# Altium integrated library LEMO Unipole And Multipole Type Connectors.IntLib: 1566 symbols (part 13 of 13) (continued)
## PLB.M0.4GL.NR (continued)
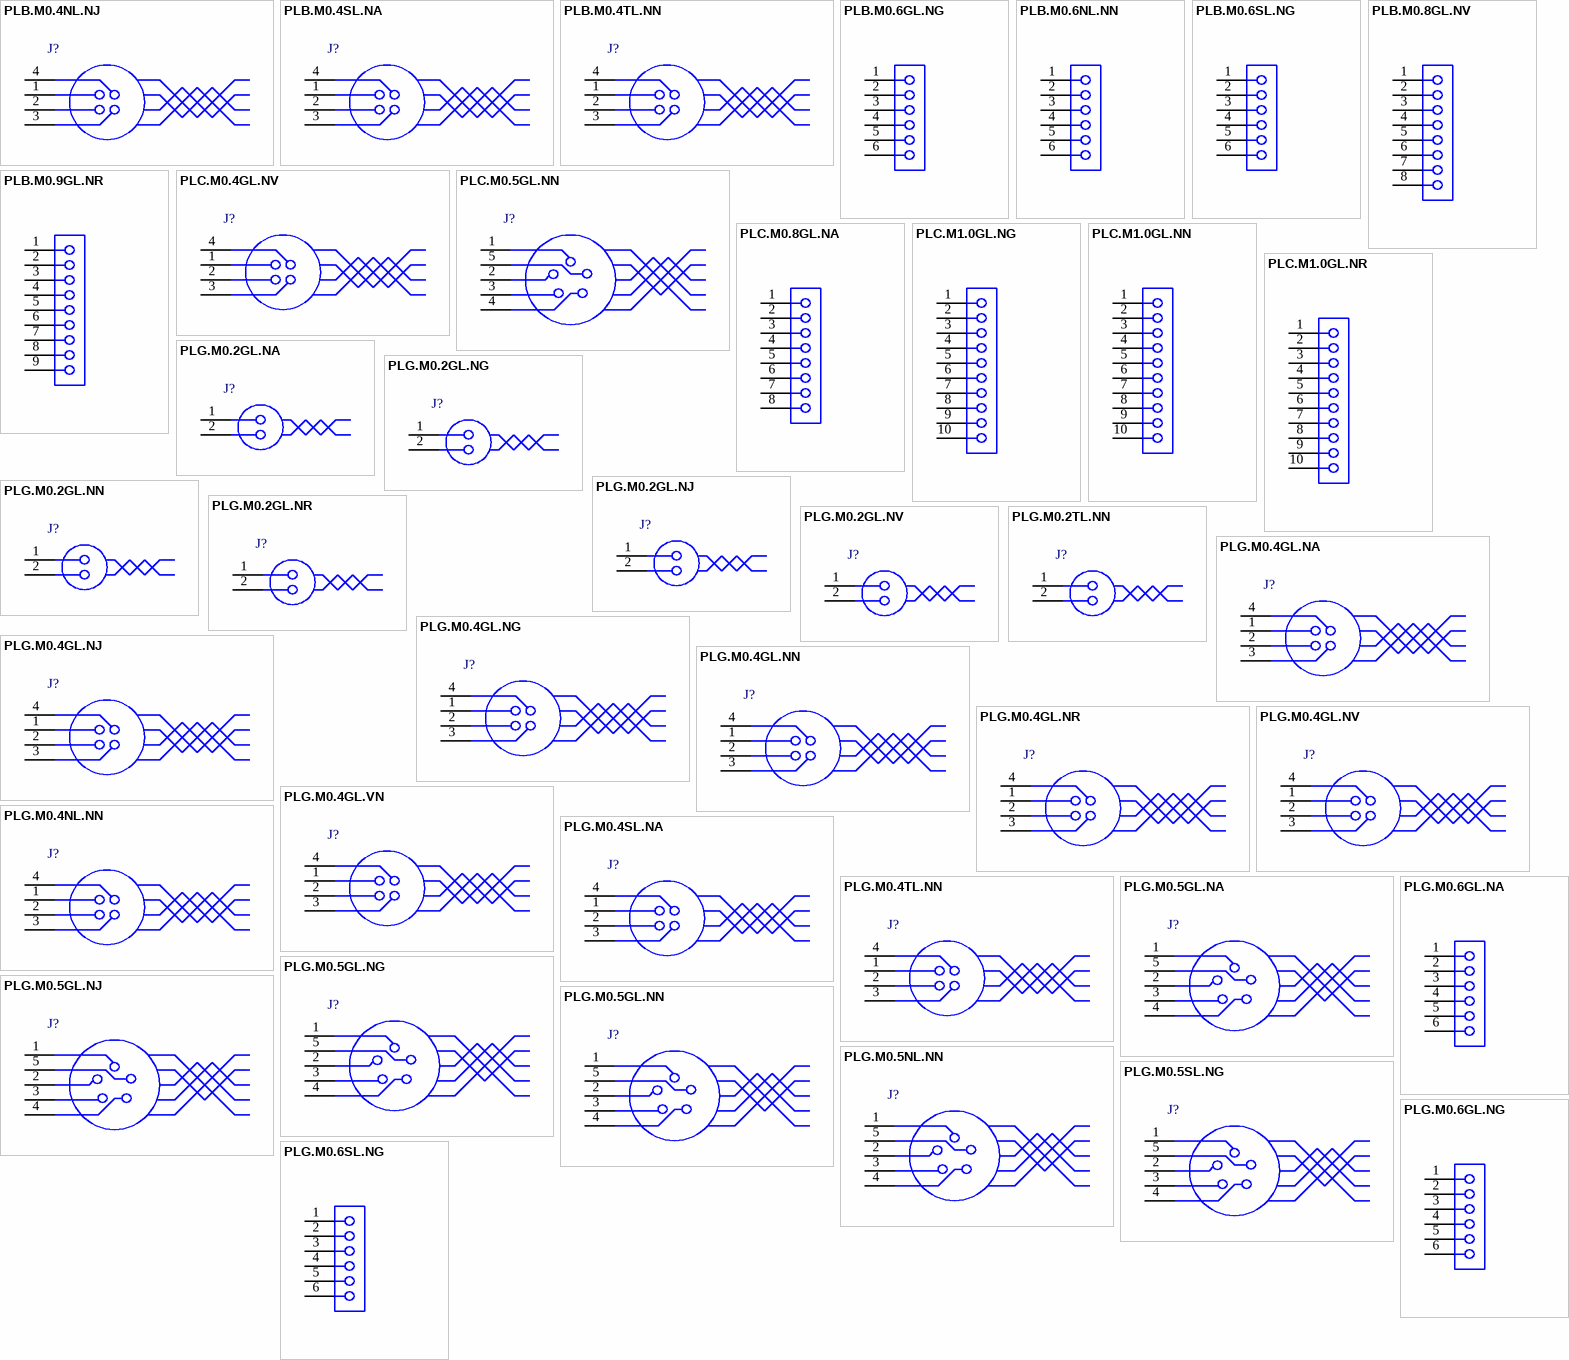
[diagram p41: symbols PLB.M0.4NL.NJ to PLG.M0.6SL.NG]

## PLB.M0.4NL.NJ
designator J?
Fixed receptacle, nut fixing, Key (B),  series, Multipole Type with 4 Contacts; Manufacturer: LEMO; PartNumber: PLB.M0.4NL.NJ; Number of contacts: 4; Contact Diameter: 0.9 mm; Test voltage (kV rms) Contact-Contact: 1.2; Rated Current(A): 8; DatasheetVersion: Jun-14; PackageReference: PLB.M0.4NL.NJ; PackageDescription: Fixed receptacle, nut fixing, Key(B) for Printed Circuit; ComponentLink1Description: Manufacturer URL; ComponentLink1URL: http://www.lemo.com; ComponentLink2Description: Datasheet; ComponentLink2URL: http://intra.lemo.ch/catalog/ROW/UK_English/P_series_catalog.pdf
footprint PLB.M0.4NL.NJ (Socket, Female, Height 25 mm, Through hole)
pins: 1, 2, 3, 4

## PLB.M0.4SL.NA
designator J?
Fixed receptacle, nut fixing, Key (B), P series, Multipole Type with 4 Contacts; Manufacturer: LEMO; PartNumber: PLB.M0.4SL.NA; Number of contacts: 4; Contact Diameter: 0.9 mm; Test voltage (kV rms) Contact-Contact: 1.2; Rated Current(A): 8; DatasheetVersion: Jun-14; PackageReference: PLB.M0.4SL.NA; PackageDescription: Fixed receptacle, nut fixing, Key(B) for Printed Circuit; ComponentLink1Description: Manufacturer URL; ComponentLink1URL: http://www.lemo.com; ComponentLink2Description: Datasheet; ComponentLink2URL: http://intra.lemo.ch/catalog/ROW/UK_English/P_series_catalog.pdf
footprint PLB.M0.4SL.NA (Socket, Female, Height 25 mm, Through hole)
pins: 1, 2, 3, 4

## PLB.M0.4TL.NN
designator J?
Fixed receptacle, nut fixing, Key (B), P series, Multipole Type with 4 Contacts; Manufacturer: LEMO; PartNumber: PLB.M0.4TL.NN; Number of contacts: 4; Contact Diameter: 0.9 mm; Test voltage (kV rms) Contact-Contact: 1.2; Rated Current(A): 8; DatasheetVersion: Jun-14; PackageReference: PLB.M0.4TL.NN; PackageDescription: Fixed receptacle, nut fixing, Key(B) for Printed Circuit; ComponentLink1Description: Manufacturer URL; ComponentLink1URL: http://www.lemo.com; ComponentLink2Description: Datasheet; ComponentLink2URL: http://intra.lemo.ch/catalog/ROW/UK_English/P_series_catalog.pdf
footprint PLB.M0.4TL.NN (Socket, Female, Height 25 mm, Through hole)
pins: 1, 2, 3, 4

## PLB.M0.6GL.NG
designator J?
Fixed receptacle, nut fixing, Key (B), P series, Multipole Type with 6 Contacts; Manufacturer: LEMO; PartNumber: PLB.M0.6GL.NG; Number of contacts: 6; Contact Diameter: 0.7 mm; Test voltage (kV rms) Contact-Contact: 1.05; DatasheetVersion: Jun-14; PackageReference: PLB.M0.6GL.NG; PackageDescription: Fixed receptacle, nut fixing, Key(B) for Printed Circuit; Rated Current(A): 6; ComponentLink1Description: Manufacturer URL; ComponentLink1URL: http://www.lemo.com; ComponentLink2Description: Datasheet; ComponentLink2URL: http://intra.lemo.ch/catalog/ROW/UK_English/P_series_catalog.pdf
footprint PLB.M0.6GL.NG (Socket, Female, Height 25 mm, Through hole)
pins: 1, 2, 3, 4, 5, 6

## PLB.M0.6NL.NN
designator J?
Fixed receptacle, nut fixing, Key (B), P series, Multipole Type with 6 Contacts; Manufacturer: LEMO; PartNumber: PLB.M0.6NL.NN; Number of contacts: 6; Contact Diameter: 0.7 mm; Test voltage (kV rms) Contact-Contact: 1.05; DatasheetVersion: Jun-14; PackageReference: PLB.M0.6NL.NN; PackageDescription: Fixed receptacle, nut fixing, Key(B) for Printed Circuit; Rated Current(A): 6; ComponentLink1Description: Manufacturer URL; ComponentLink1URL: http://www.lemo.com; ComponentLink2Description: Datasheet; ComponentLink2URL: http://intra.lemo.ch/catalog/ROW/UK_English/P_series_catalog.pdf
footprint PLB.M0.6NL.NN (Socket, Female, Height 25 mm, Through hole)
pins: 1, 2, 3, 4, 5, 6

## PLB.M0.6SL.NG
designator J?
Fixed receptacle, nut fixing, Key (B), P series, Multipole Type with 6 Contacts; Manufacturer: LEMO; PartNumber: PLB.M0.6SL.NG; Number of contacts: 6; Contact Diameter: 0.7 mm; Test voltage (kV rms) Contact-Contact: 1.05; DatasheetVersion: Jun-14; PackageReference: PLB.M0.6SL.NG; PackageDescription: Fixed receptacle, nut fixing, Key(B) for Printed Circuit; Rated Current(A): 6; ComponentLink1Description: Manufacturer URL; ComponentLink1URL: http://www.lemo.com; ComponentLink2Description: Datasheet; ComponentLink2URL: http://intra.lemo.ch/catalog/ROW/UK_English/P_series_catalog.pdf
footprint PLB.M0.6SL.NG (Socket, Female, Height 25 mm, Through hole)
pins: 1, 2, 3, 4, 5, 6

## PLB.M0.8GL.NV
designator J?
Fixed receptacle, nut fixing, Key (B), P series, Multipole Type with 8 Contacts; Manufacturer: LEMO; PartNumber: PLB.M0.8GL.NV; Number of contacts: 8; Contact Diameter: 0.7 mm; Test voltage (kV rms) Contact-Contact: 1.05; Rated Current(A): 5; DatasheetVersion: Jun-14; PackageReference: PLB.M0.8GL.NV; PackageDescription: Fixed receptacle, nut fixing, Key(B) for Printed Circuit; ComponentLink1Description: Manufacturer URL; ComponentLink1URL: http://www.lemo.com; ComponentLink2Description: Datasheet; ComponentLink2URL: http://intra.lemo.ch/catalog/ROW/UK_English/P_series_catalog.pdf
footprint PLB.M0.8GL.NV (Socket, Female, Height 25 mm, Through hole)
pins: 1, 2, 3, 4, 5, 6, 7, 8

## PLB.M0.9GL.NR
designator J?
Fixed receptacle, nut fixing, Key (B), P series, Multipole Type with 9 Contacts; Manufacturer: LEMO; PartNumber: PLB.M0.9GL.NR; Number of contacts: 9; Contact Diameter: 0.5 mm; Test voltage (kV rms) Contact-Contact: 0.85; Rated Current(A): 3; DatasheetVersion: Jun-14; PackageReference: PLB.M0.9GL.NR; PackageDescription: Fixed receptacle, nut fixing, Key(B) for Printed Circuit; ComponentLink1Description: Manufacturer URL; ComponentLink1URL: http://www.lemo.com; ComponentLink2Description: Datasheet; ComponentLink2URL: http://intra.lemo.ch/catalog/ROW/UK_English/P_series_catalog.pdf
footprint PLB.M0.9GL.NR (Socket, Female, Height 25 mm, Through hole)
pins: 1, 2, 3, 4, 5, 6, 7, 8, 9

## PLC.M0.4GL.NV
designator J?
Fixed receptacle, nut fixing, Key (C), P series, Multipole Type with 4 Contacts; Manufacturer: LEMO; PartNumber: PLC.M0.4GL.NV; Number of contacts: 4; Contact Diameter: 0.9 mm; Test voltage (kV rms) Contact-Contact: 1.2; Rated Current(A): 8; DatasheetVersion: Jun-14; PackageReference: PLC.M0.4GL.NV; PackageDescription: Fixed receptacle, nut fixing, Key(C) for Printed Circuit; ComponentLink1Description: Manufacturer URL; ComponentLink1URL: http://www.lemo.com; ComponentLink2Description: Datasheet; ComponentLink2URL: http://intra.lemo.ch/catalog/ROW/UK_English/P_series_catalog.pdf
footprint PLC.M0.4GL.NV (Socket, Female, Height 25 mm, Through hole)
pins: 1, 2, 3, 4

## PLC.M0.5GL.NN
designator J?
Fixed receptacle, nut fixing, Key (C), P series, Multipole Type with 5 Contacts; Manufacturer: LEMO; PartNumber: PLC.M0.5GL.NN; Number of contacts: 5; Contact Diameter: 0.9 mm; Test voltage (kV rms) Contact-Contact: 1.05; Rated Current(A): 7; DatasheetVersion: Jun-14; PackageReference: PLC.M0.5GL.NN; PackageDescription: Fixed receptacle, nut fixing, Key(C) for Printed Circuit; ComponentLink1Description: Manufacturer URL; ComponentLink1URL: http://www.lemo.com; ComponentLink2Description: Datasheet; ComponentLink2URL: http://intra.lemo.ch/catalog/ROW/UK_English/P_series_catalog.pdf
footprint PLC.M0.5GL.NN (Socket, Female, Height 25 mm, Through hole)
pins: 1, 2, 3, 4, 5

## PLC.M0.8GL.NA
designator J?
Fixed receptacle, nut fixing, Key (C), P series, Multipole Type with 8 Contacts; Manufacturer: LEMO; PartNumber: PLC.M0.8GL.NA; Number of contacts: 8; Contact Diameter: 0.7 mm; Test voltage (kV rms) Contact-Contact: 1.05; Rated Current(A): 5; DatasheetVersion: Jun-14; PackageReference: PLC.M0.8GL.NA; PackageDescription: Fixed receptacle, nut fixing, Key(C) for Printed Circuit; ComponentLink1Description: Manufacturer URL; ComponentLink1URL: http://www.lemo.com; ComponentLink2Description: Datasheet; ComponentLink2URL: http://intra.lemo.ch/catalog/ROW/UK_English/P_series_catalog.pdf
footprint PLC.M0.8GL.NA (Socket, Female, Height 25 mm, Through hole)
pins: 1, 2, 3, 4, 5, 6, 7, 8

## PLC.M1.0GL.NG
designator J?
Fixed receptacle, nut fixing, Key (C), P series, Multipole Type with 10 Contacts; Manufacturer: LEMO; PartNumber: PLC.M1.0GL.NG; Number of contacts: 10; Contact Diameter: 0.5 mm; Test voltage (kV rms) Contact-Contact: 0.85; Rated Current(A): 3; DatasheetVersion: Jun-14; PackageReference: PLC.M1.0GL.NG; PackageDescription: Fixed receptacle, nut fixing, Key(C) for Printed Circuit; ComponentLink1Description: Manufacturer URL; ComponentLink1URL: http://www.lemo.com; ComponentLink2Description: Datasheet; ComponentLink2URL: http://intra.lemo.ch/catalog/ROW/UK_English/P_series_catalog.pdf
footprint PLC.M1.0GL.NG (Socket, Female, Height 25 mm, Through hole)
pins: 1, 2, 3, 4, 5, 6, 7, 8, 9, 10

## PLC.M1.0GL.NN
designator J?
Fixed receptacle, nut fixing, Key (C), P series, Multipole Type with 10 Contacts; Manufacturer: LEMO; PartNumber: PLC.M1.0GL.NN; Number of contacts: 10; Contact Diameter: 0.5 mm; Test voltage (kV rms) Contact-Contact: 0.85; Rated Current(A): 3; DatasheetVersion: Jun-14; PackageReference: PLC.M1.0GL.NN; PackageDescription: Fixed receptacle, nut fixing, Key(C) for Printed Circuit; ComponentLink1Description: Manufacturer URL; ComponentLink1URL: http://www.lemo.com; ComponentLink2Description: Datasheet; ComponentLink2URL: http://intra.lemo.ch/catalog/ROW/UK_English/P_series_catalog.pdf
footprint PLC.M1.0GL.NN (Socket, Female, Height 25 mm, Through hole)
pins: 1, 2, 3, 4, 5, 6, 7, 8, 9, 10

## PLC.M1.0GL.NR
designator J?
Fixed receptacle, nut fixing, Key (C), P series, Multipole Type with 10 Contacts; Manufacturer: LEMO; PartNumber: PLC.M1.0GL.NR; Number of contacts: 10; Contact Diameter: 0.5 mm; Test voltage (kV rms) Contact-Contact: 0.85; Rated Current(A): 3; DatasheetVersion: Jun-14; PackageReference: PLC.M1.0GL.NR; PackageDescription: Fixed receptacle, nut fixing, Key(C) for Printed Circuit; ComponentLink1Description: Manufacturer URL; ComponentLink1URL: http://www.lemo.com; ComponentLink2Description: Datasheet; ComponentLink2URL: http://intra.lemo.ch/catalog/ROW/UK_English/P_series_catalog.pdf
footprint PLC.M1.0GL.NR (Socket, Female, Height 25 mm, Through hole)
pins: 1, 2, 3, 4, 5, 6, 7, 8, 9, 10

## PLG.M0.2GL.NA
designator J?
Fixed receptacle, nut fixing, Key (G), P series, Multipole Type with 2 Contacts; Manufacturer: LEMO; PartNumber: PLG.M0.2GL.NA; Number of contacts: 2; Contact Diameter: 1.3 mm; Test voltage (kV rms) Contact-Contact: 1.2; Rated Current(A): 10; DatasheetVersion: Jun-14; PackageReference: PLG.M0.2GL.NA; PackageDescription: Fixed receptacle, nut fixing, Key(G) for Printed Circuit; ComponentLink1Description: Manufacturer URL; ComponentLink1URL: http://www.lemo.com; ComponentLink2Description: Datasheet; ComponentLink2URL: http://intra.lemo.ch/catalog/ROW/UK_English/P_series_catalog.pdf
footprint PLG.M0.2GL.NA (Socket, Female, Height 25 mm, Through hole)
pins: 1, 2

## PLG.M0.2GL.NG
designator J?
Fixed receptacle, nut fixing, Key (G), P series, Multipole Type with 2 Contacts; Manufacturer: LEMO; PartNumber: PLG.M0.2GL.NG; Number of contacts: 2; Contact Diameter: 1.3 mm; Test voltage (kV rms) Contact-Contact: 1.2; Rated Current(A): 10; DatasheetVersion: Jun-14; PackageReference: PLG.M0.2GL.NG; PackageDescription: Fixed receptacle, nut fixing, Key(G) for Printed Circuit; ComponentLink1Description: Manufacturer URL; ComponentLink1URL: http://www.lemo.com; ComponentLink2Description: Datasheet; ComponentLink2URL: http://intra.lemo.ch/catalog/ROW/UK_English/P_series_catalog.pdf
footprint PLG.M0.2GL.NG (Socket, Female, Height 25 mm, Through hole)
pins: 1, 2

## PLG.M0.2GL.NJ
designator J?
Fixed receptacle, nut fixing, Key (G), P series, Multipole Type with 2 Contacts; Manufacturer: LEMO; PartNumber: PLG.M0.2GL.NJ; Number of contacts: 2; Contact Diameter: 1.3 mm; Test voltage (kV rms) Contact-Contact: 1.2; Rated Current(A): 10; DatasheetVersion: Jun-14; PackageReference: PLG.M0.2GL.NJ; PackageDescription: Fixed receptacle, nut fixing, Key(G) for Printed Circuit; ComponentLink1Description: Manufacturer URL; ComponentLink1URL: http://www.lemo.com; ComponentLink2Description: Datasheet; ComponentLink2URL: http://intra.lemo.ch/catalog/ROW/UK_English/P_series_catalog.pdf
footprint PLG.M0.2GL.NJ (Socket, Female, Height 25 mm, Through hole)
pins: 1, 2

## PLG.M0.2GL.NN
designator J?
Fixed receptacle, nut fixing, Key (G), P series, Multipole Type with 2 Contacts; Manufacturer: LEMO; PartNumber: PLG.M0.2GL.NN; Number of contacts: 2; Contact Diameter: 1.3 mm; Test voltage (kV rms) Contact-Contact: 1.2; Rated Current(A): 10; DatasheetVersion: Jun-14; PackageReference: PLG.M0.2GL.NN; PackageDescription: Fixed receptacle, nut fixing, Key(G) for Printed Circuit; ComponentLink1Description: Manufacturer URL; ComponentLink1URL: http://www.lemo.com; ComponentLink2Description: Datasheet; ComponentLink2URL: http://intra.lemo.ch/catalog/ROW/UK_English/P_series_catalog.pdf
footprint PLG.M0.2GL.NN (Socket, Female, Height 25 mm, Through hole)
pins: 1, 2

## PLG.M0.2GL.NR
designator J?
Fixed receptacle, nut fixing, Key (G), P series, Multipole Type with 2 Contacts; Manufacturer: LEMO; PartNumber: PLG.M0.2GL.NR; Number of contacts: 2; Contact Diameter: 1.3 mm; Test voltage (kV rms) Contact-Contact: 1.2; Rated Current(A): 10; DatasheetVersion: Jun-14; PackageReference: PLG.M0.2GL.NR; PackageDescription: Fixed receptacle, nut fixing, Key(G) for Printed Circuit; ComponentLink1Description: Manufacturer URL; ComponentLink1URL: http://www.lemo.com; ComponentLink2Description: Datasheet; ComponentLink2URL: http://intra.lemo.ch/catalog/ROW/UK_English/P_series_catalog.pdf
footprint PLG.M0.2GL.NR (Socket, Female, Height 25 mm, Through hole)
pins: 1, 2

## PLG.M0.2GL.NV
designator J?
Fixed receptacle, nut fixing, Key (G), P series, Multipole Type with 2 Contacts; Manufacturer: LEMO; PartNumber: PLG.M0.2GL.NV; Number of contacts: 2; Contact Diameter: 1.3 mm; Test voltage (kV rms) Contact-Contact: 1.2; Rated Current(A): 10; DatasheetVersion: Jun-14; PackageReference: PLG.M0.2GL.NV; PackageDescription: Fixed receptacle, nut fixing, Key(G) for Printed Circuit; ComponentLink1Description: Manufacturer URL; ComponentLink1URL: http://www.lemo.com; ComponentLink2Description: Datasheet; ComponentLink2URL: http://intra.lemo.ch/catalog/ROW/UK_English/P_series_catalog.pdf
footprint PLG.M0.2GL.NV (Socket, Female, Height 25 mm, Through hole)
pins: 1, 2

## PLG.M0.2TL.NN
designator J?
Fixed receptacle, nut fixing, Key (G), P series, Multipole Type with 2 Contacts; Manufacturer: LEMO; PartNumber: PLG.M0.2TL.NN; Number of contacts: 2; Contact Diameter: 1.3 mm; Test voltage (kV rms) Contact-Contact: 1.2; Rated Current(A): 10; DatasheetVersion: Jun-14; PackageReference: PLG.M0.2TL.NN; PackageDescription: Fixed receptacle, nut fixing, Key(G) for Printed Circuit; ComponentLink1Description: Manufacturer URL; ComponentLink1URL: http://www.lemo.com; ComponentLink2Description: Datasheet; ComponentLink2URL: http://intra.lemo.ch/catalog/ROW/UK_English/P_series_catalog.pdf
footprint PLG.M0.2TL.NN (Socket, Female, Height 25 mm, Through hole)
pins: 1, 2

## PLG.M0.4GL.NA
designator J?
Fixed receptacle, nut fixing, Key (G), P series, Multipole Type with 4 Contacts; Manufacturer: LEMO; PartNumber: PLG.M0.4GL.NA; Number of contacts: 4; Contact Diameter: 0.9 mm; Test voltage (kV rms) Contact-Contact: 1.2; Rated Current(A): 8; DatasheetVersion: Jun-14; PackageReference: PLG.M0.4GL.NA; PackageDescription: Fixed receptacle, nut fixing, Key(G) for Printed Circuit; ComponentLink1Description: Manufacturer URL; ComponentLink1URL: http://www.lemo.com; ComponentLink2Description: Datasheet; ComponentLink2URL: http://intra.lemo.ch/catalog/ROW/UK_English/P_series_catalog.pdf
footprint PLG.M0.4GL.NA (Socket, Female, Height 25 mm, Through hole)
pins: 1, 2, 3, 4

## PLG.M0.4GL.NG
designator J?
Fixed receptacle, nut fixing, Key (G), P series, Multipole Type with 4 Contacts; Manufacturer: LEMO; PartNumber: PLG.M0.4GL.NG; Number of contacts: 4; Contact Diameter: 0.9 mm; Test voltage (kV rms) Contact-Contact: 1.2; Rated Current(A): 8; DatasheetVersion: Jun-14; PackageReference: PLG.M0.4GL.NG; PackageDescription: Fixed receptacle, nut fixing, Key(G) for Printed Circuit; ComponentLink1Description: Manufacturer URL; ComponentLink1URL: http://www.lemo.com; ComponentLink2Description: Datasheet; ComponentLink2URL: http://intra.lemo.ch/catalog/ROW/UK_English/P_series_catalog.pdf
footprint PLG.M0.4GL.NG (Socket, Female, Height 25 mm, Through hole)
pins: 1, 2, 3, 4

## PLG.M0.4GL.NJ
designator J?
Fixed receptacle, nut fixing, Key (G), P series, Multipole Type with 4 Contacts; Manufacturer: LEMO; PartNumber: PLG.M0.4GL.NJ; Number of contacts: 4; Contact Diameter: 0.9 mm; Test voltage (kV rms) Contact-Contact: 1.2; Rated Current(A): 8; DatasheetVersion: Jun-14; PackageReference: PLG.M0.4GL.NJ; PackageDescription: Fixed receptacle, nut fixing, Key(G) for Printed Circuit; ComponentLink1Description: Manufacturer URL; ComponentLink1URL: http://www.lemo.com; ComponentLink2Description: Datasheet; ComponentLink2URL: http://intra.lemo.ch/catalog/ROW/UK_English/P_series_catalog.pdf
footprint PLG.M0.4GL.NJ (Socket, Female, Height 25 mm, Through hole)
pins: 1, 2, 3, 4

## PLG.M0.4GL.NN
designator J?
Fixed receptacle, nut fixing, Key (G), P series, Multipole Type with 4 Contacts; Manufacturer: LEMO; PartNumber: PLG.M0.4GL.NN; Number of contacts: 4; Contact Diameter: 0.9 mm; Test voltage (kV rms) Contact-Contact: 1.2; Rated Current(A): 8; DatasheetVersion: Jun-14; PackageReference: PLG.M0.4GL.NN; PackageDescription: Fixed receptacle, nut fixing, Key(G) for Printed Circuit; ComponentLink1Description: Manufacturer URL; ComponentLink1URL: http://www.lemo.com; ComponentLink2Description: Datasheet; ComponentLink2URL: http://intra.lemo.ch/catalog/ROW/UK_English/P_series_catalog.pdf
footprint PLG.M0.4GL.NN (Socket, Female, Height 25 mm, Through hole)
pins: 1, 2, 3, 4

## PLG.M0.4GL.NR
designator J?
Fixed receptacle, nut fixing, Key (G), P series, Multipole Type with 4 Contacts; Manufacturer: LEMO; PartNumber: PLG.M0.4GL.NR; Number of contacts: 4; Contact Diameter: 0.9 mm; Test voltage (kV rms) Contact-Contact: 1.2; Rated Current(A): 8; DatasheetVersion: Jun-14; PackageReference: PLG.M0.4GL.NR; PackageDescription: Fixed receptacle, nut fixing, Key(G) for Printed Circuit; ComponentLink1Description: Manufacturer URL; ComponentLink1URL: http://www.lemo.com; ComponentLink2Description: Datasheet; ComponentLink2URL: http://intra.lemo.ch/catalog/ROW/UK_English/P_series_catalog.pdf
footprint PLG.M0.4GL.NR (Socket, Female, Height 25 mm, Through hole)
pins: 1, 2, 3, 4

## PLG.M0.4GL.NV
designator J?
Fixed receptacle, nut fixing, Key (G), P series, Multipole Type with 4 Contacts; Manufacturer: LEMO; PartNumber: PLG.M0.4GL.NV; Number of contacts: 4; Contact Diameter: 0.9 mm; Test voltage (kV rms) Contact-Contact: 1.2; Rated Current(A): 8; DatasheetVersion: Jun-14; PackageReference: PLG.M0.4GL.NV; PackageDescription: Fixed receptacle, nut fixing, Key(G) for Printed Circuit; ComponentLink1Description: Manufacturer URL; ComponentLink1URL: http://www.lemo.com; ComponentLink2Description: Datasheet; ComponentLink2URL: http://intra.lemo.ch/catalog/ROW/UK_English/P_series_catalog.pdf
footprint PLG.M0.4GL.NV (Socket, Female, Height 25 mm, Through hole)
pins: 1, 2, 3, 4

## PLG.M0.4GL.VN
designator J?
Fixed receptacle, nut fixing, Key (G), P series, Multipole Type with 4 Contacts; Manufacturer: LEMO; PartNumber: PLG.M0.4GL.VN; Number of contacts: 4; Contact Diameter: 0.9 mm; Test voltage (kV rms) Contact-Contact: 1.2; Rated Current(A): 8; DatasheetVersion: Jun-14; PackageReference: PLG.M0.4GL.VN; PackageDescription: Fixed receptacle, nut fixing, Key(G) for Printed Circuit; ComponentLink1Description: Manufacturer URL; ComponentLink1URL: http://www.lemo.com; ComponentLink2Description: Datasheet; ComponentLink2URL: http://intra.lemo.ch/catalog/ROW/UK_English/P_series_catalog.pdf
footprint PLG.M0.4GL.VN (Socket, Female, Height 25 mm, Through hole)
pins: 1, 2, 3, 4

## PLG.M0.4NL.NN
designator J?
Fixed receptacle, nut fixing, Key (G), P series, Multipole Type with 4 Contacts; Manufacturer: LEMO; PartNumber: PLG.M0.4NL.NN; Number of contacts: 4; Contact Diameter: 0.9 mm; Test voltage (kV rms) Contact-Contact: 1.2; Rated Current(A): 8; DatasheetVersion: Jun-14; PackageReference: PLG.M0.4NL.NN; PackageDescription: Fixed receptacle, nut fixing, Key(G) for Printed Circuit; ComponentLink1Description: Manufacturer URL; ComponentLink1URL: http://www.lemo.com; ComponentLink2Description: Datasheet; ComponentLink2URL: http://intra.lemo.ch/catalog/ROW/UK_English/P_series_catalog.pdf
footprint PLG.M0.4NL.NN (Socket, Female, Height 25 mm, Through hole)
pins: 1, 2, 3, 4

## PLG.M0.4SL.NA
designator J?
Fixed receptacle, nut fixing, Key (G), P series, Multipole Type with 4 Contacts; Manufacturer: LEMO; PartNumber: PLG.M0.4SL.NA; Number of contacts: 4; Contact Diameter: 0.9 mm; Test voltage (kV rms) Contact-Contact: 1.2; Rated Current(A): 8; DatasheetVersion: Jun-14; PackageReference: PLG.M0.4SL.NA; PackageDescription: Fixed receptacle, nut fixing, Key(G) for Printed Circuit; ComponentLink1Description: Manufacturer URL; ComponentLink1URL: http://www.lemo.com; ComponentLink2Description: Datasheet; ComponentLink2URL: http://intra.lemo.ch/catalog/ROW/UK_English/P_series_catalog.pdf
footprint PLG.M0.4SL.NA (Socket, Female, Height 25 mm, Through hole)
pins: 1, 2, 3, 4

## PLG.M0.4TL.NN
designator J?
Fixed receptacle, nut fixing, Key (G), P series, Multipole Type with 4 Contacts; Manufacturer: LEMO; PartNumber: PLG.M0.4TL.NN; Number of contacts: 4; Contact Diameter: 0.9 mm; Test voltage (kV rms) Contact-Contact: 1.2; Rated Current(A): 8; DatasheetVersion: Jun-14; PackageReference: PLG.M0.4TL.NN; PackageDescription: Fixed receptacle, nut fixing, Key(G) for Printed Circuit; ComponentLink1Description: Manufacturer URL; ComponentLink1URL: http://www.lemo.com; ComponentLink2Description: Datasheet; ComponentLink2URL: http://intra.lemo.ch/catalog/ROW/UK_English/P_series_catalog.pdf
footprint PLG.M0.4TL.NN (Socket, Female, Height 25 mm, Through hole)
pins: 1, 2, 3, 4

## PLG.M0.5GL.NA
designator J?
Fixed receptacle, nut fixing, Key (G), P series, Multipole Type with 5 Contacts; Manufacturer: LEMO; PartNumber: PLG.M0.5GL.NA; Number of contacts: 5; Contact Diameter: 0.9 mm; Test voltage (kV rms) Contact-Contact: 1.05; Rated Current(A): 7; DatasheetVersion: Jun-14; PackageReference: PLG.M0.5GL.NA; PackageDescription: Fixed receptacle, nut fixing, Key(G) for Printed Circuit; ComponentLink1Description: Manufacturer URL; ComponentLink1URL: http://www.lemo.com; ComponentLink2Description: Datasheet; ComponentLink2URL: http://intra.lemo.ch/catalog/ROW/UK_English/P_series_catalog.pdf
footprint PLG.M0.5GL.NA (Socket, Female, Height 25 mm, Through hole)
pins: 1, 2, 3, 4, 5

## PLG.M0.5GL.NG
designator J?
Fixed receptacle, nut fixing, Key (G), P series, Multipole Type with 5 Contacts; Manufacturer: LEMO; PartNumber: PLG.M0.5GL.NG; Number of contacts: 5; Contact Diameter: 0.9 mm; Test voltage (kV rms) Contact-Contact: 1.05; Rated Current(A): 7; DatasheetVersion: Jun-14; PackageReference: PLG.M0.5GL.NG; PackageDescription: Fixed receptacle, nut fixing, Key(G) for Printed Circuit; ComponentLink1Description: Manufacturer URL; ComponentLink1URL: http://www.lemo.com; ComponentLink2Description: Datasheet; ComponentLink2URL: http://intra.lemo.ch/catalog/ROW/UK_English/P_series_catalog.pdf
footprint PLG.M0.5GL.NG (Socket, Female, Height 25 mm, Through hole)
pins: 1, 2, 3, 4, 5

## PLG.M0.5GL.NJ
designator J?
Fixed receptacle, nut fixing, Key (G), P series, Multipole Type with 5 Contacts; Manufacturer: LEMO; PartNumber: PLG.M0.5GL.NJ; Number of contacts: 5; Contact Diameter: 0.9 mm; Test voltage (kV rms) Contact-Contact: 1.05; Rated Current(A): 7; DatasheetVersion: Jun-14; PackageReference: PLG.M0.5GL.NJ; PackageDescription: Fixed receptacle, nut fixing, Key(G) for Printed Circuit; ComponentLink1Description: Manufacturer URL; ComponentLink1URL: http://www.lemo.com; ComponentLink2Description: Datasheet; ComponentLink2URL: http://intra.lemo.ch/catalog/ROW/UK_English/P_series_catalog.pdf
footprint PLG.M0.5GL.NJ (Socket, Female, Height 25 mm, Through hole)
pins: 1, 2, 3, 4, 5

## PLG.M0.5GL.NN
designator J?
Fixed receptacle, nut fixing, Key (G), P series, Multipole Type with 5 Contacts; Manufacturer: LEMO; PartNumber: PLG.M0.5GL.NN; Number of contacts: 5; Contact Diameter: 0.9 mm; Test voltage (kV rms) Contact-Contact: 1.05; Rated Current(A): 7; DatasheetVersion: Jun-14; PackageReference: PLG.M0.5GL.NN; PackageDescription: Fixed receptacle, nut fixing, Key(G) for Printed Circuit; ComponentLink1Description: Manufacturer URL; ComponentLink1URL: http://www.lemo.com; ComponentLink2Description: Datasheet; ComponentLink2URL: http://intra.lemo.ch/catalog/ROW/UK_English/P_series_catalog.pdf
footprint PLG.M0.5GL.NN (Socket, Female, Height 25 mm, Through hole)
pins: 1, 2, 3, 4, 5

## PLG.M0.5NL.NN
designator J?
Fixed receptacle, nut fixing, Key (G), P series, Multipole Type with 5 Contacts; Manufacturer: LEMO; PartNumber: PLG.M0.5NL.NN; Number of contacts: 5; Contact Diameter: 0.9 mm; Test voltage (kV rms) Contact-Contact: 1.05; Rated Current(A): 7; DatasheetVersion: Jun-14; PackageReference: PLG.M0.5NL.NN; PackageDescription: Fixed receptacle, nut fixing, Key(G) for Printed Circuit; ComponentLink1Description: Manufacturer URL; ComponentLink1URL: http://www.lemo.com; ComponentLink2Description: Datasheet; ComponentLink2URL: http://intra.lemo.ch/catalog/ROW/UK_English/P_series_catalog.pdf
footprint PLG.M0.5NL.NN (Socket, Female, Height 25 mm, Through hole)
pins: 1, 2, 3, 4, 5

## PLG.M0.5SL.NG
designator J?
Fixed receptacle, nut fixing, Key (G), P series, Multipole Type with 5 Contacts; Manufacturer: LEMO; PartNumber: PLG.M0.5SL.NG; Number of contacts: 5; Contact Diameter: 0.9 mm; Test voltage (kV rms) Contact-Contact: 1.05; Rated Current(A): 7; DatasheetVersion: Jun-14; PackageReference: PLG.M0.5SL.NG; PackageDescription: Fixed receptacle, nut fixing, Key(G) for Printed Circuit; Supplier 1: Mouser; Supplier Part Number 1: 736-PLGM05SLNG; Supplier 2: Digi-Key; Supplier Part Number 2: PLG.M0.5SL.NG-ND; ComponentLink1Description: Manufacturer URL; ComponentLink1URL: http://www.lemo.com; ComponentLink2Description: Datasheet; ComponentLink2URL: http://intra.lemo.ch/catalog/ROW/UK_English/P_series_catalog.pdf
footprint PLG.M0.5SL.NG (Socket, Female, Height 25 mm, Through hole)
pins: 1, 2, 3, 4, 5

## PLG.M0.6GL.NA
designator J?
Fixed receptacle, nut fixing, Key (G), P series, Multipole Type with 6 Contacts; Manufacturer: LEMO; PartNumber: PLG.M0.6GL.NA; Number of contacts: 6; Contact Diameter: 0.7 mm; Test voltage (kV rms) Contact-Contact: 1.05; DatasheetVersion: Jun-14; PackageReference: PLG.M0.6GL.NA; PackageDescription: Fixed receptacle, nut fixing, Key(G) for Printed Circuit; Rated Current(A): 6; ComponentLink1Description: Manufacturer URL; ComponentLink1URL: http://www.lemo.com; ComponentLink2Description: Datasheet; ComponentLink2URL: http://intra.lemo.ch/catalog/ROW/UK_English/P_series_catalog.pdf
footprint PLG.M0.6GL.NA (Socket, Female, Height 25 mm, Through hole)
pins: 1, 2, 3, 4, 5, 6

## PLG.M0.6GL.NG
designator J?
Fixed receptacle, nut fixing, Key (G), P series, Multipole Type with 6 Contacts; Manufacturer: LEMO; PartNumber: PLG.M0.6GL.NG; Number of contacts: 6; Contact Diameter: 0.7 mm; Test voltage (kV rms) Contact-Contact: 1.05; DatasheetVersion: Jun-14; PackageReference: PLG.M0.6GL.NG; PackageDescription: Fixed receptacle, nut fixing, Key(G) for Printed Circuit; Rated Current(A): 6; ComponentLink1Description: Manufacturer URL; ComponentLink1URL: http://www.lemo.com; ComponentLink2Description: Datasheet; ComponentLink2URL: http://intra.lemo.ch/catalog/ROW/UK_English/P_series_catalog.pdf
footprint PLG.M0.6GL.NG (Socket, Female, Height 25 mm, Through hole)
pins: 1, 2, 3, 4, 5, 6

## PLG.M0.6SL.NG
designator J?
Fixed receptacle, nut fixing, Key (G), P series, Multipole Type with 6 Contacts; Manufacturer: LEMO; PartNumber: PLG.M0.6SL.NG; Number of contacts: 6; Contact Diameter: 0.7 mm; Test voltage (kV rms) Contact-Contact: 1.05; DatasheetVersion: Jun-14; PackageReference: PLG.M0.6SL.NG; PackageDescription: Fixed receptacle, nut fixing, Key(G) for Printed Circuit; Rated Current(A): 6; ComponentLink1Description: Manufacturer URL; ComponentLink1URL: http://www.lemo.com; ComponentLink2Description: Datasheet; ComponentLink2URL: http://intra.lemo.ch/catalog/ROW/UK_English/P_series_catalog.pdf
footprint PLG.M0.6SL.NG (Socket, Female, Height 25 mm, Through hole)
pins: 1, 2, 3, 4, 5, 6
